# Altium footprint library pcb_Active.PcbLib: 86 footprints (part 5 of 6)
Each footprint in its own frame and in the unit in brackets; x right, y up, seen from the top. Pads: shape width x height; smd on the part's side, far side on the other; paste and mask are expansions set on the pad; w line width, h text height; cw(c..) or ccw(c..) is an arc to the next point about the centre after c.
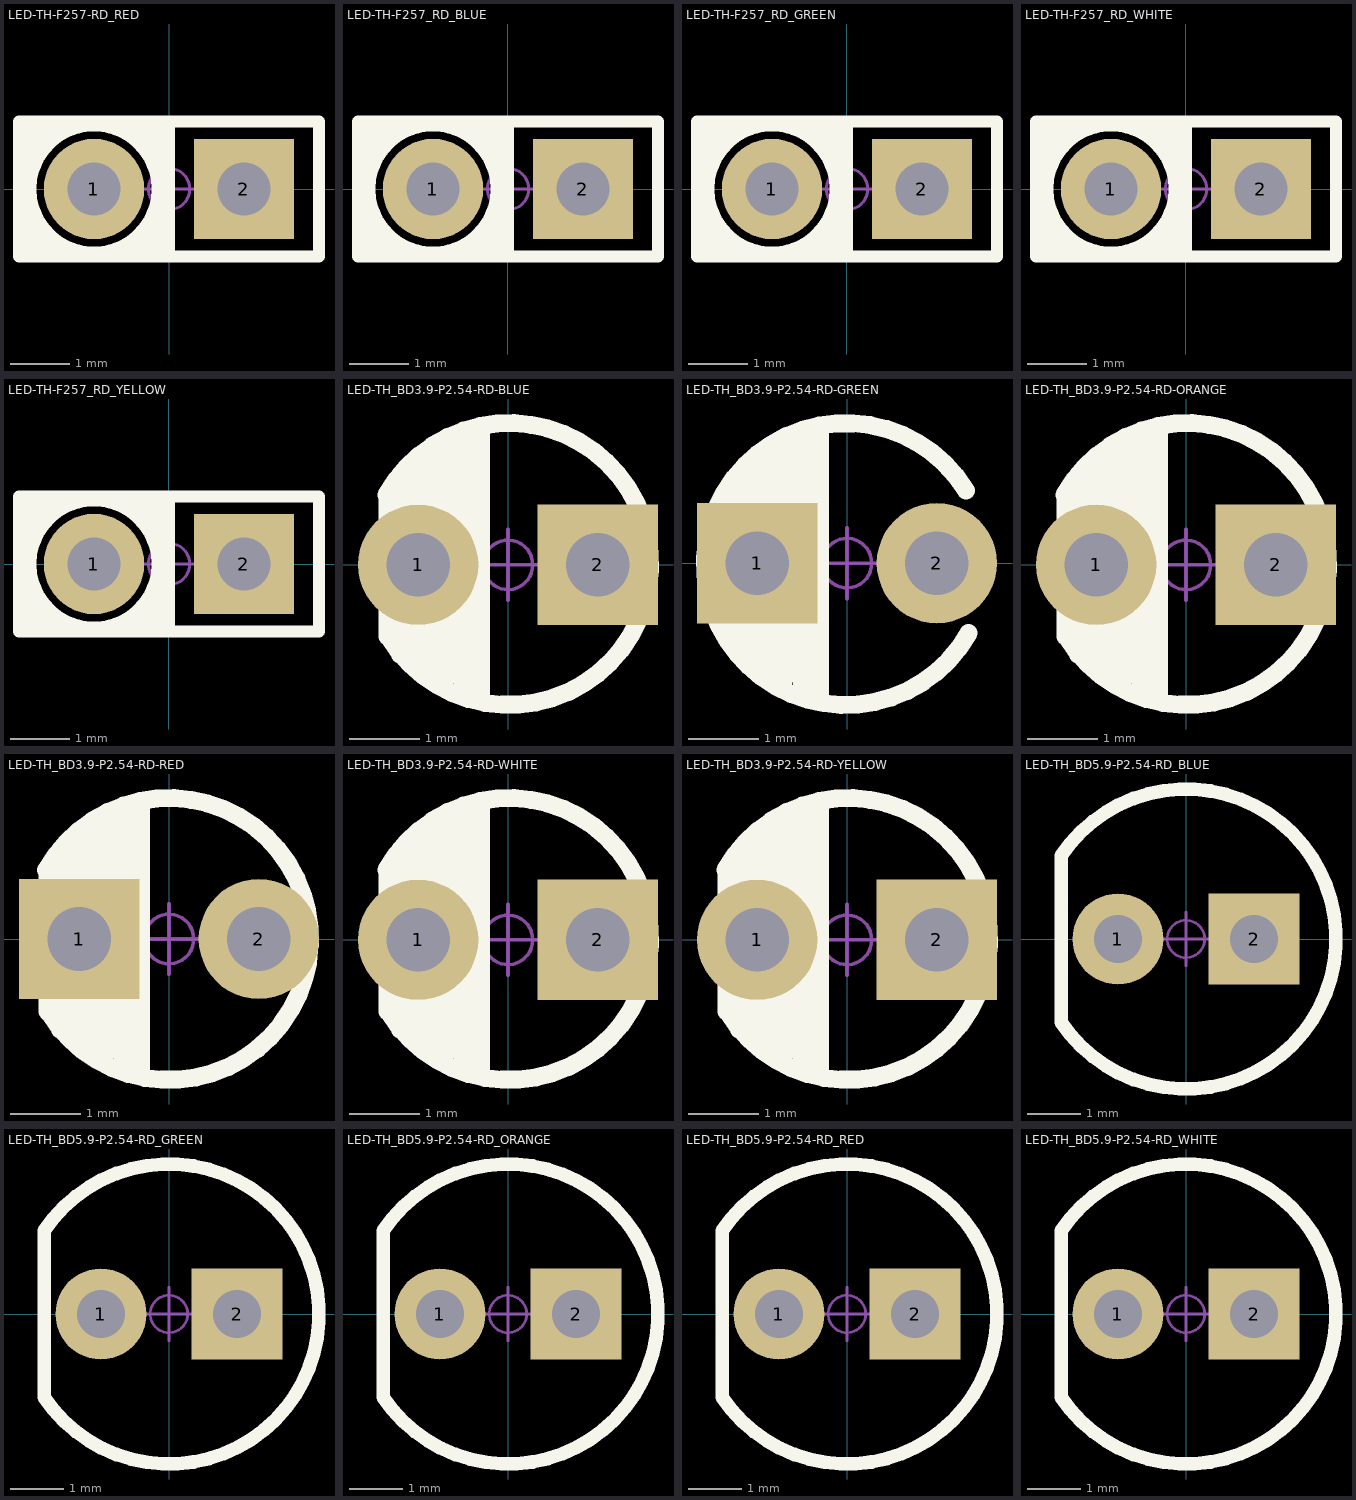
[diagram p4: the footprints below, top view; thin cyan lines are the x and y axes]

## LED-TH-F257-RD_RED [mm] "红色2mm*5mm*7mm(长*宽*高)"
pads (2):
  round 1.7 hole 0.9: 1(-1.27,0)
  rect 1.7x1.7 hole 0.9: 2(1.27,0)
Top Overlay:
  circle w0.203: c-1.27,0 r1.078
  lines w0.203: -2.54,-0.889 -2.286,-1.143 ; -2.54,-0.635 -2.032,-1.143 ; -2.54,-0.381 -1.778,-1.143 -1.905,-1.143 ; -2.54,0.381 -1.778,1.143 ; -2.54,0.635 -2.032,1.143 ; -2.54,0.889 -2.286,1.143 ; -2.413,-0.508 -2.413,0.508 ; -0.762,-1.143 0,-0.381 ; -0.762,1.143 -0.635,1.016 0,0.381 ; -0.508,-1.143 0,-0.635 ; -0.508,1.143 0,0.635 ; -0.254,-1.143 0,-0.889 0,-0.762 ; -0.254,1.143 0,0.889 ; -0.127,-0.508 -0.127,0.635 ; 0,-1.143 0,1.143 ; -2.54,-1.143 2.54,-1.143 2.54,1.143 -2.54,1.143 -2.54,-1.143
Mechanical 15:
  circle w0.05: c0,0 r0.35
  lines w0.05: -0.5,0 0.5,0 ; 0,-0.5 0,0.5
Mechanical 16:
  text ".Designator" at 0,0 h1
3D body "LED F257透明罩.STEP": height 7.05, standoff 0.05, extent -2.5,-1 2.5,1
3D body "LED F234-R.STEP": height 3.01, standoff -3.45, extent -1.52,-0.833 1.52,0.833

## LED-TH-F257_RD_BLUE [mm] "蓝色2mm*5mm*7mm(长*宽*高)"
pads (2):
  round 1.7 hole 0.9: 1(-1.27,0)
  rect 1.7x1.7 hole 0.9: 2(1.27,0)
Top Overlay:
  circle w0.203: c-1.27,0 r1.078
  lines w0.203: -2.54,-0.889 -2.286,-1.143 ; -2.54,-0.635 -2.032,-1.143 ; -2.54,-0.381 -1.778,-1.143 -1.905,-1.143 ; -2.54,0.381 -1.778,1.143 ; -2.54,0.635 -2.032,1.143 ; -2.54,0.889 -2.286,1.143 ; -2.413,-0.508 -2.413,0.508 ; -0.762,-1.143 0,-0.381 ; -0.762,1.143 -0.635,1.016 0,0.381 ; -0.508,-1.143 0,-0.635 ; -0.508,1.143 0,0.635 ; -0.254,-1.143 0,-0.889 0,-0.762 ; -0.254,1.143 0,0.889 ; -0.127,-0.508 -0.127,0.635 ; 0,-1.143 0,1.143 ; -2.54,-1.143 2.54,-1.143 2.54,1.143 -2.54,1.143 -2.54,-1.143
Mechanical 15:
  circle w0.05: c0,0 r0.35
  lines w0.05: -0.5,0 0.5,0 ; 0,-0.5 0,0.5
Mechanical 16:
  text ".Designator" at 0,0 h1
3D body "LED F234-B.STEP": height 3.01, standoff -3.45, extent -1.52,-0.833 1.52,0.833
3D body "LED F257透明罩.STEP": height 7.05, standoff 0.05, extent -2.5,-1 2.5,1

## LED-TH-F257_RD_GREEN [mm] "绿色2mm*5mm*7mm(长*宽*高)"
pads (2):
  round 1.7 hole 0.9: 1(-1.27,0)
  rect 1.7x1.7 hole 0.9: 2(1.27,0)
Top Overlay:
  circle w0.203: c-1.27,0 r1.078
  lines w0.203: -2.54,-0.889 -2.286,-1.143 ; -2.54,-0.635 -2.032,-1.143 ; -2.54,-0.381 -1.778,-1.143 -1.905,-1.143 ; -2.54,0.381 -1.778,1.143 ; -2.54,0.635 -2.032,1.143 ; -2.54,0.889 -2.286,1.143 ; -2.413,-0.508 -2.413,0.508 ; -0.762,-1.143 0,-0.381 ; -0.762,1.143 -0.635,1.016 0,0.381 ; -0.508,-1.143 0,-0.635 ; -0.508,1.143 0,0.635 ; -0.254,-1.143 0,-0.889 0,-0.762 ; -0.254,1.143 0,0.889 ; -0.127,-0.508 -0.127,0.635 ; 0,-1.143 0,1.143 ; -2.54,-1.143 2.54,-1.143 2.54,1.143 -2.54,1.143 -2.54,-1.143
Mechanical 15:
  circle w0.05: c0,0 r0.35
  lines w0.05: -0.5,0 0.5,0 ; 0,-0.5 0,0.5
Mechanical 16:
  text ".Designator" at 0,0 h1
3D body "LED F257透明罩.STEP": height 7.05, standoff 0.05, extent -2.5,-1 2.5,1
3D body "LED F234-G.STEP": height 3.01, standoff -3.45, extent -1.52,-0.833 1.52,0.833

## LED-TH-F257_RD_WHITE [mm] "透明色2mm*5mm*7mm(长*宽*高)"
pads (2):
  round 1.7 hole 0.9: 1(-1.27,0)
  rect 1.7x1.7 hole 0.9: 2(1.27,0)
Top Overlay:
  circle w0.203: c-1.27,0 r1.078
  lines w0.203: -2.54,-0.889 -2.286,-1.143 ; -2.54,-0.635 -2.032,-1.143 ; -2.54,-0.381 -1.778,-1.143 -1.905,-1.143 ; -2.54,0.381 -1.778,1.143 ; -2.54,0.635 -2.032,1.143 ; -2.54,0.889 -2.286,1.143 ; -2.413,-0.508 -2.413,0.508 ; -0.762,-1.143 0,-0.381 ; -0.762,1.143 -0.635,1.016 0,0.381 ; -0.508,-1.143 0,-0.635 ; -0.508,1.143 0,0.635 ; -0.254,-1.143 0,-0.889 0,-0.762 ; -0.254,1.143 0,0.889 ; -0.127,-0.508 -0.127,0.635 ; 0,-1.143 0,1.143 ; -2.54,-1.143 -2.54,1.143 2.54,1.143 2.54,-1.143 -2.54,-1.143
Mechanical 15:
  circle w0.05: c0,0 r0.35
  lines w0.05: -0.5,0 0.5,0 ; 0,-0.5 0,0.5
Mechanical 16:
  text ".Designator" at 0,0 h1
3D body "LED F257透明罩.STEP": height 7.05, standoff 0.05, extent -2.5,-1 2.5,1
3D body "LED F234-W.STEP": height 3.01, standoff -3.45, extent -1.52,-0.833 1.52,0.833

## LED-TH-F257_RD_YELLOW [mm] "黄色2mm*5mm*7mm(长*宽*高)"
pads (2):
  round 1.7 hole 0.9: 1(-1.27,0)
  rect 1.7x1.7 hole 0.9: 2(1.27,0)
Top Overlay:
  circle w0.203: c-1.27,0 r1.078
  lines w0.203: -2.54,-0.889 -2.286,-1.143 ; -2.54,-0.635 -2.032,-1.143 ; -2.54,-0.381 -1.778,-1.143 -1.905,-1.143 ; -2.54,0.381 -1.778,1.143 ; -2.54,0.635 -2.032,1.143 ; -2.54,0.889 -2.286,1.143 ; -2.413,-0.508 -2.413,0.508 ; -0.762,-1.143 0,-0.381 ; -0.762,1.143 -0.635,1.016 0,0.381 ; -0.508,-1.143 0,-0.635 ; -0.508,1.143 0,0.635 ; -0.254,-1.143 0,-0.889 0,-0.762 ; -0.254,1.143 0,0.889 ; -0.127,-0.508 -0.127,0.635 ; 0,-1.143 0,1.143 ; -2.54,-1.143 -2.54,1.143 2.54,1.143 2.54,-1.143 -2.54,-1.143
Mechanical 15:
  circle w0.05: c0,0 r0.35
  lines w0.05: -0.5,0 0.5,0 ; 0,-0.5 0,0.5
Mechanical 16:
  text ".Designator" at 0,0 h1
3D body "LED F234-Y.STEP": height 3.01, standoff -3.45, extent -1.52,-0.833 1.52,0.833
3D body "LED F257透明罩.STEP": height 7.05, standoff 0.05, extent -2.5,-1 2.5,1

## LED-TH_BD3.9-P2.54-RD-BLUE [mm] "蓝色3mm直插LED"
height 6.35
pads (2):
  round 1.7 hole 0.9: 1(-1.27,0)
  rect 1.7x1.7 hole 0.9: 2(1.27,0)
Top Overlay:
  lines w0.254: -1.72,0.987 cw(c0.016,0.012) -1.685,-1.025 ; -1.702,-1.016 -1.702,0.965 ; -1.524,-1.27 -1.524,1.27 -1.27,1.524 -1.27,-1.397 -1.143,-1.524 -1.016,-1.524 ; -1.016,1.651 -1.016,-1.524 ; -0.635,-1.778 -0.635,1.778 ; -0.381,-1.905 -0.381,1.905 ; -1.016,-1.524 -0.889,-1.651 ; -0.889,-1.651 -0.889,1.778 -0.889,-1.651
Mechanical 15:
  circle w0.05: c0,0 r0.35
  lines w0.05: -0.5,0 0.5,0 ; 0,-0.5 0,0.5
Mechanical 16:
  text ".Designator" at 0,0 h1
3D body "LED 3mm-B.STEP": height 3, standoff -3.45, extent -1.618,-0.833 1.623,0.833
3D body "LED 3mm-玻璃罩.STEP": height 5.55, standoff 0.05, extent -1.638,-1.945 1.95,1.945

## LED-TH_BD3.9-P2.54-RD-GREEN [mm] "绿色3mm直插LED"
height 6.35
pads (2):
  rect 1.7x1.7 hole 0.9: 1(-1.27,0)
  round 1.7 hole 0.9: 2(1.27,0)
Top Overlay:
  lines w0.254: -1.702,-1.016 -1.702,0.965 ; -1.524,-1.27 -1.524,1.27 -1.27,1.524 -1.27,-1.397 -1.143,-1.524 -1.016,-1.524 ; -1.016,1.651 -1.016,-1.524 ; -0.635,-1.778 -0.635,1.778 ; -0.381,-1.905 -0.381,1.905 ; 1.685,1.025 ccw(c-0.016,-0.012) 1.72,-0.987 ; -1.016,-1.524 -0.889,-1.651 ; -0.889,-1.651 -0.889,1.778 -0.889,-1.651
Mechanical 15:
  circle w0.05: c0,0 r0.35
  lines w0.05: -0.5,0 0.5,0 ; 0,-0.5 0,0.5
Mechanical 16:
  text ".Designator" at 0,0 h1
3D body "LED 3mm-玻璃罩.STEP": height 5.55, standoff 0.05, extent -1.638,-1.945 1.95,1.945
3D body "LED 3mm-G.STEP": height 3.01, standoff -3.45, extent -1.618,-0.833 1.623,0.833

## LED-TH_BD3.9-P2.54-RD-ORANGE [mm] "橙色3mm直插LED"
height 6.35
pads (2):
  round 1.7 hole 0.9: 1(-1.27,0)
  rect 1.7x1.7 hole 0.9: 2(1.27,0)
Top Overlay:
  lines w0.254: -1.72,0.987 cw(c0.016,0.012) -1.685,-1.025 ; -1.702,-1.016 -1.702,0.965 ; -1.524,-1.27 -1.524,1.27 -1.27,1.524 -1.27,-1.397 -1.143,-1.524 -1.016,-1.524 ; -1.016,1.651 -1.016,-1.524 ; -0.889,1.778 -0.889,-1.651 -1.016,-1.524 ; -0.635,-1.778 -0.635,1.778 ; -0.381,-1.905 -0.381,1.905
Mechanical 15:
  circle w0.05: c0,0 r0.35
  lines w0.05: -0.5,0 0.5,0 ; 0,-0.5 0,0.5
Mechanical 16:
  text ".Designator" at 0,0 h1
3D body "LED 3mm-玻璃罩.STEP": height 5.55, standoff 0.05, extent -1.638,-1.945 1.95,1.945
3D body "LED 3mm-YC.STEP": height 3, standoff -3.45, extent -1.618,-0.833 1.623,0.833

## LED-TH_BD3.9-P2.54-RD-RED [mm] "红色3mm直插LED"
height 6.35
pads (2):
  rect 1.7x1.7 hole 0.9: 1(-1.27,0)
  round 1.7 hole 0.9: 2(1.27,0)
Top Overlay:
  lines w0.254: -1.736,0.976 cw(c0,0) -1.7,-1.037 ; -1.718,-1.028 -1.718,0.953 ; -1.54,-1.282 -1.54,1.258 -1.286,1.512 -1.286,-1.409 -1.159,-1.536 -1.032,-1.536 ; -1.032,1.639 -1.032,-1.536 ; -0.651,-1.79 -0.651,1.766 ; -0.397,-1.917 -0.397,1.893 ; -1.032,-1.536 -0.905,-1.663 ; -0.905,-1.663 -0.905,1.766 -0.905,-1.663
Mechanical 15:
  circle w0.05: c0,0 r0.35
  lines w0.05: -0.5,0 0.5,0 ; 0,-0.5 0,0.5
Mechanical 16:
  text ".Designator" at 0,0 h1
3D body "LED 3mm-R.STEP": height 3.01, standoff -3.45, extent -1.618,-0.833 1.623,0.833
3D body "LED 3mm-玻璃罩.ST": height 5.55, standoff 0.05, extent -1.638,-1.945 1.95,1.945

## LED-TH_BD3.9-P2.54-RD-WHITE [mm] "白色3mm直插LED"
height 6.35
pads (2):
  round 1.7 hole 0.9: 1(-1.27,0)
  rect 1.7x1.7 hole 0.9: 2(1.27,0)
Top Overlay:
  lines w0.254: -1.72,0.987 cw(c0.016,0.012) -1.685,-1.025 ; -1.702,-1.016 -1.702,0.965 ; -1.524,-1.27 -1.524,1.27 -1.27,1.524 -1.27,-1.397 -1.143,-1.524 -1.016,-1.524 ; -1.016,1.651 -1.016,-1.524 ; -0.635,-1.778 -0.635,1.778 ; -0.381,-1.905 -0.381,1.905 ; -1.016,-1.524 -0.889,-1.651 ; -0.889,-1.651 -0.889,1.778 -0.889,-1.651
Mechanical 15:
  circle w0.05: c0,0 r0.35
  lines w0.05: -0.5,0 0.5,0 ; 0,-0.5 0,0.5
Mechanical 16:
  text ".Designator" at 0,0 h1
3D body "LED 3mm-W.STEP": height 2.56, standoff -3.45, extent -1.618,-0.765 1.623,0.765
3D body "LED 3mm-玻璃罩.STEP": height 5.55, standoff 0.05, extent -1.638,-1.945 1.95,1.945

## LED-TH_BD3.9-P2.54-RD-YELLOW [mm] "黄色3mm直插LED"
height 6.35
pads (2):
  round 1.7 hole 0.9: 1(-1.27,0)
  rect 1.7x1.7 hole 0.9: 2(1.27,0)
Top Overlay:
  lines w0.254: -1.72,0.987 cw(c0.016,0.012) -1.685,-1.025 ; -1.702,-1.016 -1.702,0.965 ; -1.524,-1.27 -1.524,1.27 -1.27,1.524 -1.27,-1.397 -1.143,-1.524 -1.016,-1.524 ; -1.016,1.651 -1.016,-1.524 ; -0.889,1.778 -0.889,-1.651 -1.016,-1.524 ; -0.635,-1.778 -0.635,1.778 ; -0.381,-1.905 -0.381,1.905
Mechanical 15:
  circle w0.05: c0,0 r0.35
  lines w0.05: -0.5,0 0.5,0 ; 0,-0.5 0,0.5
Mechanical 16:
  text ".Designator" at 0,0 h1
3D body "LED 3mm-玻璃罩.STEP": height 5.55, standoff 0.05, extent -1.638,-1.945 1.95,1.945
3D body "LED 3mm-Y.STEP": height 2.56, standoff -3.45, extent -1.618,-0.833 1.623,0.833

## LED-TH_BD5.9-P2.54-RD_BLUE [mm] "蓝色5mm直插LED"
height 10.16
pads (2):
  round 1.7 hole 0.9: 1(-1.27,0)
  rect 1.7x1.7 hole 0.9: 2(1.27,0)
Top Overlay:
  lines w0.254: -2.33,-1.553 ccw(c0,0) -2.33,1.553 -2.33,-1.553
Mechanical 15:
  circle w0.05: c0,0 r0.35
  lines w0.05: -0.5,0 0.5,0 ; 0,-0.5 0,0.5
Mechanical 16:
  text ".Designator" at 0,0 h1
3D body "LED 5mm-B.STEP": height 4.5, standoff -3.45, extent -2.076,-0.8 1.983,0.79
3D body "LED 5mm玻璃罩.STEP": height 8.75, standoff 0.05, extent -2.454,-2.841 2.85,2.841

## LED-TH_BD5.9-P2.54-RD_GREEN [mm] "绿色5mm直插LED"
height 10.16
pads (2):
  round 1.7 hole 0.9: 1(-1.27,0)
  rect 1.7x1.7 hole 0.9: 2(1.27,0)
Top Overlay:
  lines w0.254: -2.33,-1.553 ccw(c0,0) -2.33,1.553 -2.33,-1.553
Mechanical 15:
  circle w0.05: c0,0 r0.35
  lines w0.05: -0.5,0 0.5,0 ; 0,-0.5 0,0.5
Mechanical 16:
  text ".Designator" at 0,0 h1
3D body "LED 5mm玻璃罩.STEP": height 8.75, standoff 0.05, extent -2.454,-2.841 2.85,2.841
3D body "LED 5mm-G.STEP": height 4.5, standoff -3.45, extent -2.076,-0.8 1.983,0.79

## LED-TH_BD5.9-P2.54-RD_ORANGE [mm] "橙色5mm直插LED"
pads (2):
  round 1.7 hole 0.9: 1(-1.27,0)
  rect 1.7x1.7 hole 0.9: 2(1.27,0)
Top Overlay:
  lines w0.254: -2.33,-1.553 ccw(c0,0) -2.33,1.553 -2.33,-1.553
Mechanical 15:
  circle w0.05: c0,0 r0.35
  lines w0.05: -0.5,0 0.5,0 ; 0,-0.5 0,0.5
Mechanical 16:
  text ".Designator" at 0,0 h1
3D body "LED 5mm-YC.STEP": height 4.5, standoff -3.45, extent -2.076,-0.8 1.983,0.79
3D body "LED 5mm玻璃罩.STEP": height 8.75, standoff 0.05, extent -2.454,-2.841 2.85,2.841

## LED-TH_BD5.9-P2.54-RD_RED [mm] "红色5mm直插LED"
height 10.16
pads (2):
  round 1.7 hole 0.9: 1(-1.27,0)
  rect 1.7x1.7 hole 0.9: 2(1.27,0)
Top Overlay:
  lines w0.254: -2.33,-1.553 ccw(c0,0) -2.33,1.553 -2.33,-1.553
Mechanical 15:
  circle w0.05: c0,0 r0.35
  lines w0.05: -0.5,0 0.5,0 ; 0,-0.5 0,0.5
Mechanical 16:
  text ".Designator" at 0,0 h1
3D body "LED 5mm玻璃罩.STEP": height 8.75, standoff 0.05, extent -2.454,-2.841 2.85,2.841
3D body "LED 5mm-R.STEP": height 4.5, standoff -3.45, extent -2.076,-0.8 1.983,0.79

## LED-TH_BD5.9-P2.54-RD_WHITE [mm] "白色5mm直插LED"
height 10.16
pads (2):
  round 1.7 hole 0.9: 1(-1.27,0)
  rect 1.7x1.7 hole 0.9: 2(1.27,0)
Top Overlay:
  lines w0.254: -2.33,-1.553 ccw(c0,0) -2.33,1.553 -2.33,-1.553
Mechanical 15:
  circle w0.05: c0,0 r0.35
  lines w0.05: -0.5,0 0.5,0 ; 0,-0.5 0,0.5
Mechanical 16:
  text ".Designator" at 0,0 h1
3D body "LED 5mm玻璃罩.STEP": height 8.75, standoff 0.05, extent -2.454,-2.841 2.85,2.841
3D body "LED 5mm-W.STEP": height 4.5, standoff -3.45, extent -2.076,-0.8 1.983,0.79